# Altium footprint library AtomlzerPcb.PcbLib: 31 footprints (part 1 of 2)
Each footprint in its own frame and in the unit in brackets; x right, y up, seen from the top. Pads: shape width x height; smd on the part's side, far side on the other; paste and mask are expansions set on the pad; w line width, h text height; cw(c..) or ccw(c..) is an arc to the next point about the centre after c.
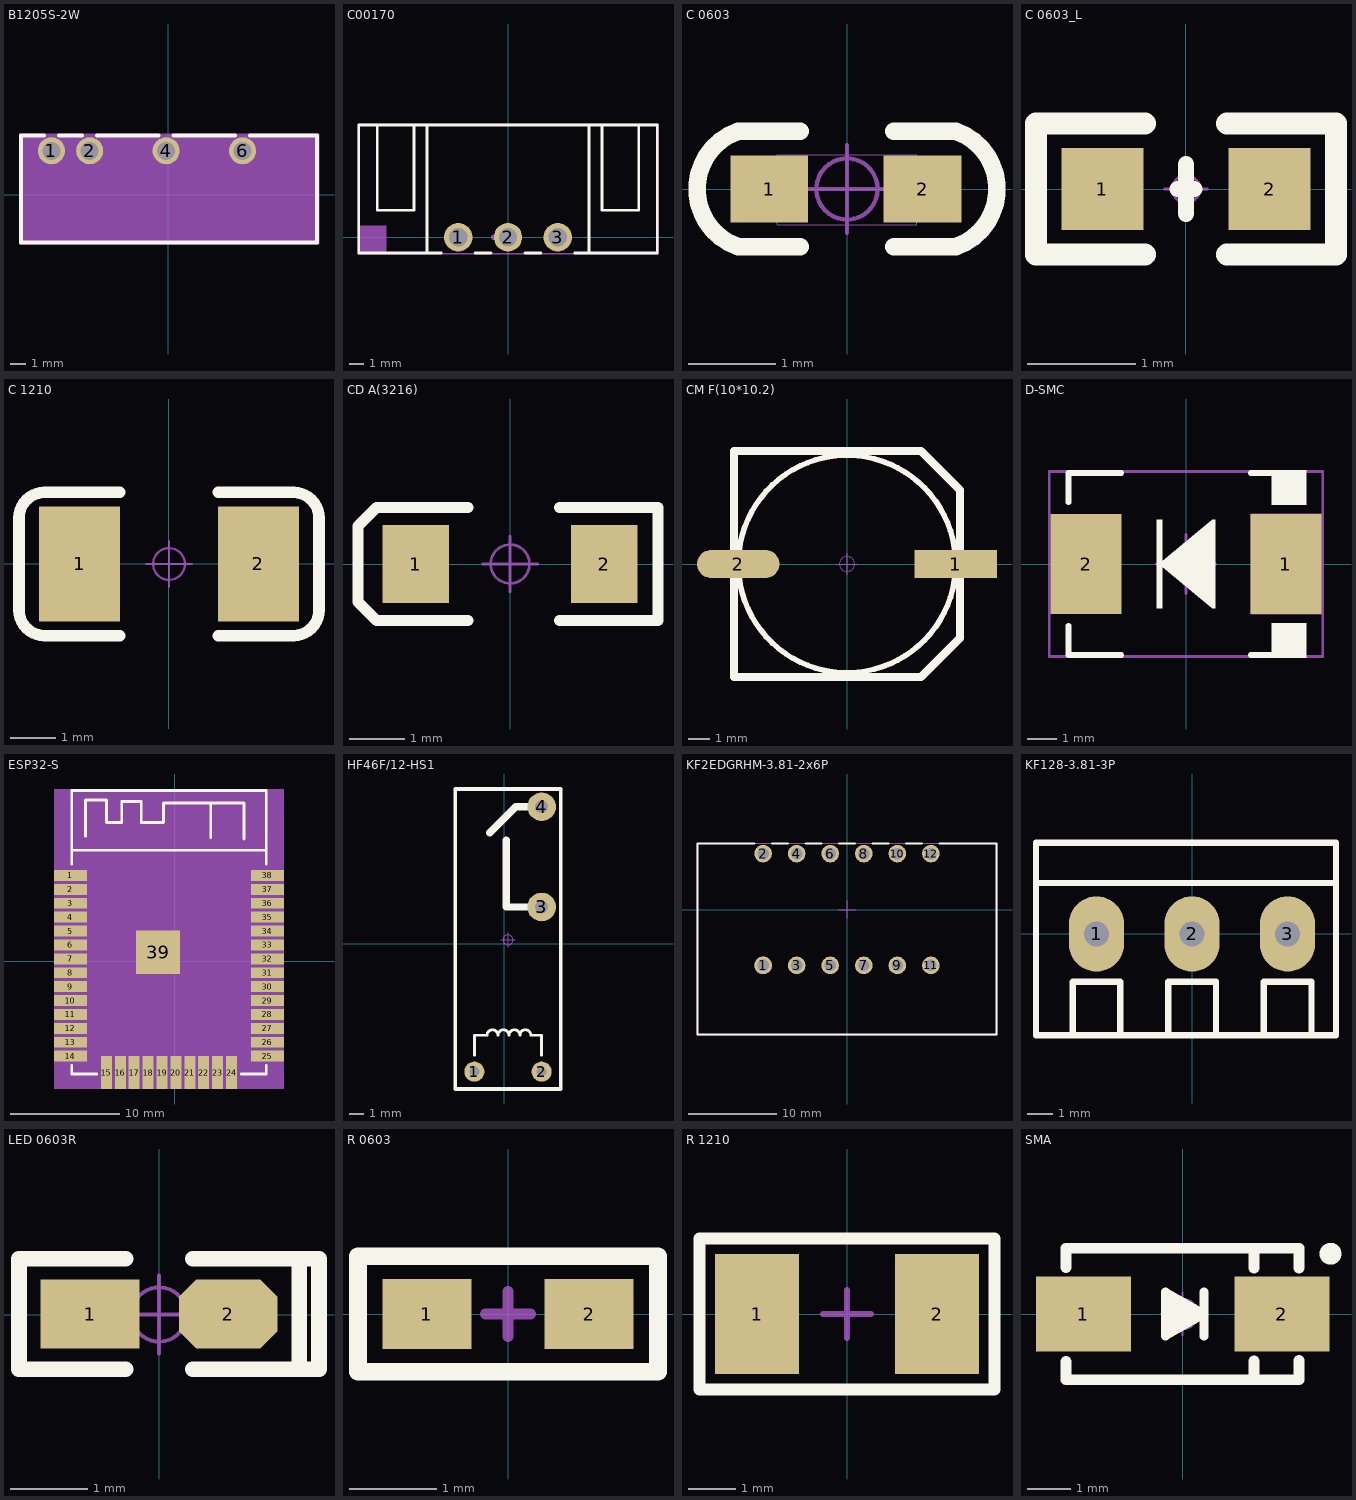
[diagram p0: the footprints below, top view; thin cyan lines are the x and y axes]

## B1205S-2W [mm]
pads (4):
  round 1.8 hole 1.2: 1(-7.747,2.921) 2(-5.207,2.921) 4(-0.127,2.921) 6(4.953,2.921)
Top Overlay:
  lines w0.254: -8.241,3.937 -9.779,3.937 -9.779,-3.175 9.906,-3.175 9.906,3.937 9.525,3.937 5.447,3.937 ; -7.253,3.937 -5.701,3.937 ; -4.713,3.937 -0.621,3.937 ; 0.367,3.937 4.459,3.937
Mechanical 4:
  region: -9.906,4.064 10.033,4.064 10.033,-3.302 -9.906,-3.302
Mechanical 5:
  region: -8.647,3.821 -6.847,3.821 -6.847,2.021 -8.647,2.021
  region: -6.107,3.821 -4.307,3.821 -4.307,2.021 -6.107,2.021
  region: -1.027,3.821 0.773,3.821 0.773,2.021 -1.027,2.021
  region: 4.053,3.821 5.853,3.821 5.853,2.021 4.053,2.021
Mechanical 15:
  lines w0.003: 0.038,0.768 0.089,0.819

## C00170 [mm]
pads (3):
  round 2 hole 1.3 mask+0.1: 1(-3.5,0) 2(0,0) 3(3.5,0)
Top Overlay:
  lines w0.2: -9.2,7.9 -9.2,1.9 -6.6,1.9 -6.6,7.9 ; -5.7,-1.1 -5.7,7.9 ; -4.7,-1.1 -10.5,-1.1 -10.5,7.9 10.5,7.9 10.5,-1.1 4.7,-1.1 ; -2.3,-1.1 -1.2,-1.1 ; 1.2,-1.1 2.3,-1.1 ; 5.7,-1.1 5.7,7.9 ; 6.6,7.9 6.6,1.9 9.2,1.9 9.2,7.9
Mechanical 1:
  circle w0.1: c0,0 r0.4
  circle w0.2: c-1,0 r0.1
  region: -10.55,0.85 -10.55,-1.15 -8.55,-1.15 -8.55,0.85
  lines w0.1: -0.8,0 0.8,0 ; 0,-0.8 0,0.8 ; -10.55,-1.15 -10.55,7.95 10.55,7.95 10.55,-1.15 -10.55,-1.15
3D body "C00170.stp": height 7.4, standoff -3.4, extent -10.55,-1.2 10.55,8

## C 0603 [mil] "无极性贴片电容"
pads (2):
  rect 35x30 smd: 1(-35,0) 2(34,0)
Top Overlay:
  lines w7.87: -21,-26 -49.02,-26 cw(c-40,0) -49.02,26 -21,26 ; 21,-26 49.02,-26 ccw(c40,0) 49.02,26 21,26
Mechanical 13:
  lines w0.39: -31.5,-16 31.5,-16 31.5,15.5 -31.5,15.5 -31.5,-16
Mechanical 15:
  circle w1.97: c0,0 r13.78
  lines w1.97: -19.69,0 19.68,0 ; 0,-19.69 0,19.68
3D body "C 0603.STEP": height 31.89, standoff -0.39, extent -31.5,-16.14 31.5,16.14

## C 0603_L [mil] "无极性贴片电容"
pads (2):
  rect 30x30 smd: 1(-30.59,0) 2(30.59,0)
Top Overlay:
  lines w6: -3,0 0,0 3,0 ; 0,-9 0,9
  lines w8: -15,-24 -54.82,-24 -54.82,24 -15,24 ; 15,-24 54.82,-24 54.82,24 15,24
Mechanical 15:
  circle w1: c0,0 r5
  lines w1: -7.87,0 7.87,0 ; 0,-7.87 0,7.87
3D body "C 0603.STEP": height 31.89, standoff -0.39, extent -31.5,-16.14 31.5,16.14

## C 1210 [mil] "无极性贴片电容"
pads (2):
  rect 70x100 smd: 1(-77.5,0) 2(77.5,0)
Top Overlay:
  lines w10: -42.5,-62 -108.06,-62 cw(c-108.06,-40.06) -130,-40.06 -130,40.06 cw(c-108.06,40.06) -108.06,62 -42.5,62 ; 42.5,-62 108.06,-62 ccw(c108.06,-40.06) 130,-40.06 130,40.06 ccw(c108.06,40.06) 108.06,62 42.5,62
Mechanical 15:
  circle w1.97: c0,0 r13.78
  lines w1.97: -19.68,0 19.69,0 ; 0,-19.69 0,19.68
3D body "C 1210.STEP": height 60.43, standoff 0.2, extent -62.99,-50.59 62.99,50.59

## CD A(3216) [mm] "长3.2mm，宽1.6mm，厚1.6mm"
pads (2):
  rect 1.2x1.4 smd: 1(-1.7,0) 2(1.7,0)
Top Overlay:
  lines w0.2: -0.762,-1.016 -2.413,-1.016 -2.743,-0.686 -2.743,0.686 -2.413,1.016 -0.762,1.016 ; 0.889,-1.016 2.667,-1.016 2.667,1.016 0.889,1.016
Mechanical 15:
  circle w0.05: c0,0 r0.35
  lines w0.05: -0.5,0 0.5,0 ; 0,-0.5 0,0.5
3D body "CD A(3216).STEP": height 1.6, standoff -0.01, extent -1.6,-0.8 1.6,0.8

## CM F(10*10.2) [mm] "贴片电解电容，直径10mm，高10.2mm"
pads (2):
  rect 3.8x1.3 smd: 1(5,0)
  oval 3.8x1.3 smd: 2(-5,0)
Top Overlay:
  circle w0.254: c0,0 r5
  lines w0.381: 5.191,-3.413 3.404,-5.2 -5.2,-5.2 -5.2,5.2 3.404,5.2 5.2,3.404 5.2,-3.404
Mechanical 15:
  circle w0.05: c0,0 r0.35
  lines w0.05: -0.5,0 0.5,0 ; 0,-0.5 0,0.5
3D body "CM F(10X10.2).STEP": height 10.2, standoff -0.01, extent -5.8,-5.15 5.8,5.15

## D-SMC [mm]
pads (2):
  rect 2.4x3.4 smd mask+0.05: 1(3.4,0) 2(-3.4,0)
Top Overlay:
  rectangle: 2.9,2 4.1,3.2
  region: 2.9,-2 2.9,-3.2 4.1,-3.2 4.1,-2
  region: 1,1.5 0.9,1.5 -0.8,0.1 -0.8,1.5 -1,1.5 -1,-1.5 -0.8,-1.5 -0.8,-0.1 0.9,-1.5 1,-1.5
  lines w0.2: -4,-2.1 -4,-3.1 -2.2,-3.1 ; -4,2.1 -4,3.1 -2.2,3.1 ; 2.2,-3.1 4,-3.1 ; 2.2,3.1 4,3.1
Mechanical 1:
  region: 2.2,1.7 4.6,1.7 4.6,0 4.4,0 4.4,0.2 3.6,0.2 3.6,1 3.2,1 3.2,0.2 2.4,0.2 2.4,0 2.2,0
  region: 4.6,-1.7 2.2,-1.7 2.2,0 2.4,0 2.4,-0.2 3.2,-0.2 3.2,-1 3.6,-1 3.6,-0.2 4.4,-0.2 4.4,0 4.6,0
  lines w0.1: -1,0 1,0 ; 0,-1 0,1 ; -4.65,-3.15 4.65,-3.15 4.65,3.15 -4.65,3.15 -4.65,-3.15
3D body "SMC.stp": height 2.66, standoff 0, extent -4,-2.95 4,2.95

## ESP32-S [mm]
pads (39):
  rect 3x1 smd: 1(-9.549,7.826) 2(-9.549,6.556) 3(-9.549,5.286) 4(-9.549,4.016) 5(-9.549,2.746) 6(-9.549,1.476) 7(-9.549,0.206) 8(-9.549,-1.064) 9(-9.549,-2.334) 10(-9.549,-3.604) 11(-9.549,-4.874) 12(-9.549,-6.144) 13(-9.549,-7.414) 14(-9.549,-8.684) 25(8.451,-8.684) 26(8.451,-7.414) 27(8.451,-6.144) 28(8.451,-4.874) 29(8.451,-3.604) 30(8.451,-2.334) 31(8.451,-1.064) 32(8.451,0.206) 33(8.451,1.476) 34(8.451,2.746) 35(8.451,4.016) 36(8.451,5.286) 37(8.451,6.556) 38(8.451,7.826)
  rect 1x3 smd: 15(-6.264,-10.184) 16(-4.994,-10.184) 17(-3.724,-10.184) 18(-2.454,-10.184) 19(-1.184,-10.184) 20(0.086,-10.184) 21(1.356,-10.184) 22(2.626,-10.184) 23(3.896,-10.184) 24(5.166,-10.184)
  rect 4x4 smd: 39(-1.549,0.816)
Top Overlay:
  lines w0.254: -9.439,-9.549 -9.439,-10.311 -7.153,-10.311 ; -9.439,8.866 -9.439,15.597 8.341,15.597 8.341,8.866 ; -9.439,10.136 8.341,10.136 ; -8.169,11.405 -8.169,14.707 -6.264,14.707 -6.264,12.675 -4.867,12.675 -4.867,14.58 -3.089,14.58 -3.089,12.675 -1.057,12.675 -1.057,14.453 6.309,14.453 6.309,11.151 ; 3.261,11.279 3.261,14.454 ; 6.055,-10.311 8.341,-10.311 8.341,-9.549
Mechanical 4:
  region: -11.049,15.724 9.957,15.724 9.957,-11.684 -11.049,-11.684
Mechanical 5:
  drawing of 39 lines, arcs and shapes, not listed
Mechanical 15:
  lines w0.003: -0.571,2.446 -0.52,2.497

## HF46F/12-HS1 [mm]
pads (4):
  round 1.4 hole 0.7: 1(-2.096,-8.946) 2(2.604,-8.946)
  round 2 hole 0.9: 3(2.604,2.554) 4(2.604,9.554)
Top Overlay:
  lines w0.2: -2.096,-7.803 -2.096,-6.406 -1.212,-6.406 cw(c-0.83,-6.406) -0.448,-6.406 cw(c-0.066,-6.406) 0.316,-6.406 cw(c0.698,-6.406) 1.08,-6.406 cw(c1.462,-6.406) 1.844,-6.406 2.604,-6.406 2.604,-7.803
  lines w0.254: -3.429,-10.16 -3.429,10.795 3.937,10.795 3.937,-10.16 -3.429,-10.16
  lines w0.508: -1.016,7.747 0.791,9.554 2.604,9.554 ; 0.127,7.239 0.127,2.568 0.141,2.554 2.604,2.554
Mechanical 15:
  circle w0.05: c0.254,0.254 r0.35
  lines w0.05: -0.246,0.254 0.754,0.254 ; 0.254,-0.246 0.254,0.754
3D body "HF46-xx-HS1.STEP": height 15.3, standoff -2.6, extent -3.246,-9.996 3.754,10.504

## KF2EDGRHM-3.81-2x6P [mm]
pads (12):
  round 2 hole 1.3 mask+0.05: 1(-9.525,-6.35) 2(-9.525,6.35) 3(-5.715,-6.35) 4(-5.715,6.35) 5(-1.905,-6.35) 6(-1.905,6.35) 7(1.905,-6.35) 8(1.905,6.35) 9(5.715,-6.35) 10(5.715,6.35) 11(9.525,-6.35) 12(9.525,6.35)
Top Overlay:
  lines w0.2: -10.525,7.5 -17,7.5 -17,-14.2 17,-14.2 17,7.5 10.525,7.5 ; -8.525,7.5 -6.715,7.5 ; -4.715,7.5 -2.905,7.5 ; -0.905,7.5 0.905,7.5 ; 2.905,7.5 4.715,7.5 ; 6.715,7.5 8.525,7.5
Mechanical 1:
  circle w1: c-9.525,-6.35 r0.5
  lines w0.1: -1,0 1,0 ; 0,-1 0,1 ; -17.05,-14.25 17.05,-14.25 17.05,7.55 -17.05,7.55 -17.05,-14.25
3D body: height 22.8, standoff 0.02, extent -17,-14.3 17,7.5

## KF128-3.81-3P [mm] "螺钉式接线端子，脚距3.81mm"
pads (3):
  oval 2.2x3 hole 1: 1(-3.81,0) 2(0,0) 3(3.81,0)
Top Overlay:
  lines w0.254: -6.223,2.032 5.74,2.032 ; -4.763,-4.039 -4.763,-1.905 -2.857,-1.905 -2.857,-4.039 ; -0.953,-4.039 -0.953,-1.905 0.953,-1.905 0.953,-4.039 ; 2.857,-4.039 2.857,-1.905 4.763,-1.905 4.763,-4.039 ; -6.223,-4.039 -6.223,3.632 5.74,3.632 5.74,-4.039 -6.223,-4.039
Mechanical 15:
  circle w0.05: c0,0 r0.35
  lines w0.05: -0.5,0 0.5,0 ; 0,-0.5 0,0.5
3D body "KF128.STEP": height 8.55, standoff -3.95, extent -2.405,-3.9 1.905,3.5
3D body "KF128.STEP": height 8.55, standoff -3.95, extent -6.215,-3.9 -1.905,3.5
3D body "KF128.STEP": height 8.55, standoff -3.95, extent 1.405,-3.9 5.715,3.5

## LED 0603R [mil] "红色0603LED"
pads (2):
  rect 50x35 smd: 1(-35,0.26)
  oct 50x35 smd: 2(35,0.26)
Top Overlay:
  lines w8: -17,-27.74 -71,-27.74 -71,-25.74 -71,28.26 -70,28.26 -17,28.26 ; 17,-27.74 70,-27.74 ; 17,28.26 71,28.26 81,28.26 81,-27.74 71,-27.74 71,26.26
Mechanical 15:
  circle w1.97: c0,0 r13.78
  lines w1.97: -19.69,0 19.68,0 ; 0,-19.69 0,19.68
3D body "LED 0603玻璃罩.STEP": height 23.82, standoff 8.07, extent -23.58,-15.79 23.58,15.79
3D body "LED 0603-R.STEP": height 18.36, standoff -0.16, extent -31.49,-15.79 31.5,15.79

## R 0603 [mil] "1/10W贴片电阻"
pads (2):
  rect 40x31.5 smd: 1(-36.5,0) 2(36.5,0)
Top Overlay:
  lines w8: -67.5,-26 67.5,-26 67.5,26 -67.5,26 -67.5,-26
Mechanical 15:
  lines w5: -10,0 10,0 ; 0,-10 0,10
3D body "R 0603.STEP": height 15.79, standoff -0.13, extent -31.49,-15.74 31.5,15.75

## R 1210 [mil] "1/3W贴片电阻"
pads (2):
  rect 70x100 smd: 1(-75,0) 2(75,0)
Top Overlay:
  lines w10: -123,-63 -123,63 123,63 123,-63 -123,-63
Mechanical 15:
  lines w5: -20,0 20,0 ; 0,-20 0,20
3D body "R 1210.STEP": height 21.69, standoff -0.32, extent -62.99,-49.2 63,49.22

## SMA [mm] "4.5x2.6*2.2mm（长宽高，不包括引脚）"
height 2.54
pads (2):
  rect 2.2x1.75 smd: 1(-2.3,0) 2(2.3,0)
Top Overlay:
  circle w0.254: c3.429,1.397 r0.127
  lines w0.203: 0.494,-0.508 0.494,0.508 ; -0.395,-0.508 -0.395,0.508 0.494,0 -0.395,-0.508
  lines w0.254: -2.7,-1.105 -2.7,-1.524 2.7,-1.524 2.7,-1.08 ; -2.7,1.08 -2.7,1.524 2.7,1.524 2.7,1.067 ; -0.33,0.305 0.305,0 -0.254,-0.305 -0.254,0.051 0.023,0 ; 1.651,-1.524 1.651,-1.092 ; 1.651,1.067 1.651,1.524
Mechanical 15:
  circle w0.05: c0,0 r0.35
  lines w0.05: -0.5,0 0.5,0 ; 0,-0.5 0,0.5
3D body "SMA.STEP": height 2.15, standoff 0.04, extent -2.528,-1.3 2.575,1.3